# Altium footprint library MYLIB.PcbLib: 600 footprints (part 1 of 39)
Each footprint in its own frame and in the unit in brackets; x right, y up, seen from the top. Pads: shape width x height; smd on the part's side, far side on the other; paste and mask are expansions set on the pad; w line width, h text height; cw(c..) or ccw(c..) is an arc to the next point about the centre after c.
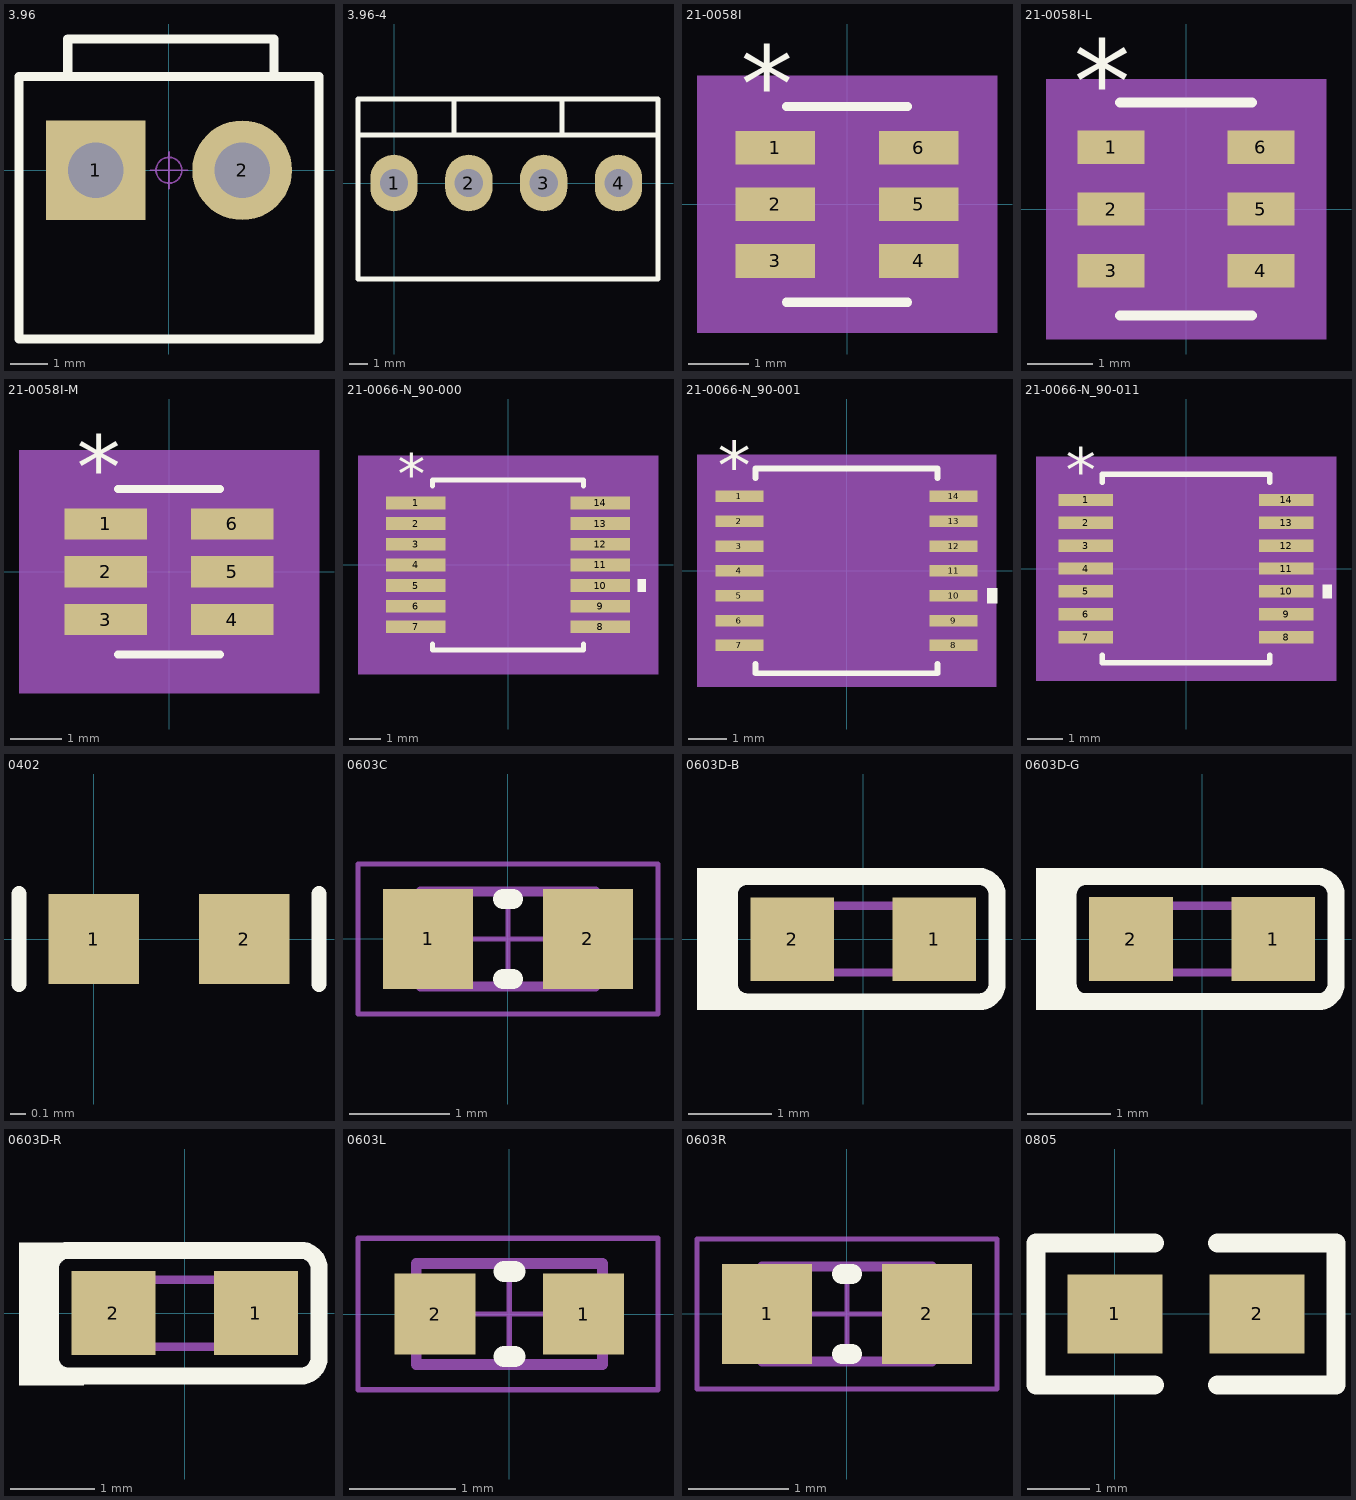
[diagram p0: the footprints below, top view; thin cyan lines are the x and y axes]

## 3.96 [mm] "接插件，25V/5A"
pads (2):
  rect 2.7x2.7 hole 1.5: 1(-1.98,0)
  round 2.7 hole 1.5: 2(1.982,0)
Top Overlay:
  lines w0.254: -2.742,2.54 -2.742,3.556 2.846,3.556 2.846,2.54 ; 4.065,0 4.065,-4.572 ; 4.065,-4.572 -2.336,-4.572 -4.063,-4.572 -4.063,2.54 4.065,2.54 4.065,-4.572
Mechanical 15:
  circle w0.05: c0,0 r0.35
  lines w0.05: -0.5,0 0.5,0 ; 0,-0.5 0,0.5
3D body "VH3.96右.STEP": height 10.5, standoff -3.3, extent -0.02,-4.4 4.03,4.16
3D body "VH3.96-左.STEP": height 10.5, standoff -3.3, extent -3.98,-4.4 0.07,4.16

## 3.96-4 [mm]
height 0.75
pads (4):
  oval 2.5x3 hole 1.5: 1(0,0) 2(3.96,0) 3(7.92,0) 4(11.88,0)
Top Overlay:
  lines w0.254: -1.905,2.54 13.97,2.54 ; 3.175,2.54 3.175,4.445 ; 8.89,2.54 8.89,4.445 ; -1.905,-5.08 13.97,-5.08 13.97,2.413 13.97,4.445 -1.905,4.445 -1.905,2.413 -1.905,-5.08
3D body: height 12, standoff 0, extent 11.137,-0.762 12.637,0.738
3D body: height 12, standoff 0, extent 7.175,-0.737 8.675,0.763
3D body: height 12, standoff 0, extent 3.212,-0.762 4.712,0.738
3D body: height 12, standoff 0, extent -0.75,-0.75 0.75,0.75
3D body: height 3, standoff 0, extent -1.904,-5.079 13.969,2.539
3D body: height 12, standoff 0, extent -1.904,2.541 3.174,4.444
3D body: height 12, standoff 0, extent 3.176,2.541 8.889,4.444
3D body: height 12, standoff 0, extent 8.891,2.541 13.969,4.444

## 21-0058I [mil]
pads (6):
  rect 52x22 smd paste+0 mask+0: 1(-47,37) 2(-47,0) 3(-47,-37) 4(47,-37) 5(47,0) 6(47,37)
Top Overlay:
  lines w6: -39.5,-64 39.5,-64 ; -39.5,64 39.5,64
  text "*" at -69.5,54 h50
Mechanical 5:
  region: 98,-84 -98,-84 -98,84 98,84
Mechanical 13:
  lines w0: -12,59 ccw(c0,59) 12,59
  lines w1: -59,-47 -34.5,-47 -34.5,-27 -59,-27 -59,-47 ; -59,-10 -34.5,-10 -34.5,10 -59,10 -59,-10 ; -59,27 -34.5,27 -34.5,47 -59,47 -59,27 ; -34.5,-59 -34.5,59 34.5,59 34.5,-59 -34.5,-59 ; 34.5,-47 59,-47 59,-27 34.5,-27 34.5,-47 ; 34.5,-10 59,-10 59,10 34.5,10 34.5,-10 ; 34.5,27 59,27 59,47 34.5,47 34.5,27
  text "*" at -32,6 h50
Mechanical 15:
  region: -44.5,-58 -83,-58 -83,58 -44.5,58 -44.5,69 44.5,69 44.5,58 83,58 83,-58 44.5,-58 44.5,-69 -44.5,-69
  lines w6: -83,-58 -44.5,-58 -44.5,-69 44.5,-69 44.5,-58 83,-58 83,58 44.5,58 44.5,69 -44.5,69 -44.5,58 -83,58 -83,-58
3D body: height 10, standoff 0, extent 0,0 10,10

## 21-0058I-L [mil]
pads (6):
  rect 40x20 smd paste+0 mask+0: 1(-45,37) 2(-45,0) 3(-45,-37) 4(45,-37) 5(45,0) 6(45,37)
Top Overlay:
  lines w6: -39.5,-64 39.5,-64 ; -39.5,64 39.5,64
  text "*" at -67.5,52 h50
Mechanical 5:
  region: 84,-78 -84,-78 -84,78 84,78
Mechanical 13:
  lines w0: -12,59 ccw(c0,59) 12,59
  lines w1: -59,-47 -59,-27 -34.5,-27 -34.5,-47 -59,-47 ; -59,-10 -59,10 -34.5,10 -34.5,-10 -59,-10 ; -59,27 -59,47 -34.5,47 -34.5,27 -59,27 ; -34.5,-59 34.5,-59 34.5,59 -34.5,59 -34.5,-59 ; 34.5,-47 34.5,-27 59,-27 59,-47 34.5,-47 ; 34.5,-10 34.5,10 59,10 59,-10 34.5,-10 ; 34.5,27 34.5,47 59,47 59,27 34.5,27
  text "*" at -32,6 h50
Mechanical 15:
  region: -38.5,-51 -69,-51 -69,51 -38.5,51 -38.5,63 38.5,63 38.5,51 69,51 69,-51 38.5,-51 38.5,-63 -38.5,-63
  lines w6: -69,-51 -69,51 -38.5,51 -38.5,63 38.5,63 38.5,51 69,51 69,-51 38.5,-51 38.5,-63 -38.5,-63 -38.5,-51 -69,-51
3D body: height 10, standoff 0, extent 0,0 10,10

## 21-0058I-M [mil]
pads (6):
  rect 64x24 smd paste+0 mask+0: 1(-49,37) 2(-49,0) 3(-49,-37) 4(49,-37) 5(49,0) 6(49,37)
Top Overlay:
  lines w6: -39.5,-64 39.5,-64 ; -39.5,64 39.5,64
  text "*" at -71.5,56 h50
Mechanical 5:
  region: 116,-94 -116,-94 -116,94 116,94
Mechanical 13:
  lines w0: -12,59 ccw(c0,59) 12,59
  lines w1: -59,-47 -59,-27 -34.5,-27 -34.5,-47 -59,-47 ; -59,-10 -59,10 -34.5,10 -34.5,-10 -59,-10 ; -59,27 -59,47 -34.5,47 -34.5,27 -59,27 ; -34.5,-59 34.5,-59 34.5,59 -34.5,59 -34.5,-59 ; 34.5,-47 34.5,-27 59,-27 59,-47 34.5,-47 ; 34.5,-10 34.5,10 59,10 59,-10 34.5,-10 ; 34.5,27 34.5,47 59,47 59,27 34.5,27
  text "*" at -32,6 h50
Mechanical 15:
  region: -54.5,-69 -101,-69 -101,69 -54.5,69 -54.5,79 54.5,79 54.5,69 101,69 101,-69 54.5,-69 54.5,-79 -54.5,-79
  lines w6: -101,-69 -101,69 -54.5,69 -54.5,79 54.5,79 54.5,69 101,69 101,-69 54.5,-69 54.5,-79 -54.5,-79 -54.5,-69 -101,-69
3D body: height 10, standoff 0, extent 0,0 10,10

## 21-0066-N_90-000 [mm]
pads (14):
  rect 1.866x0.402 smd paste+0 mask+0: 1(-2.901,1.95) 2(-2.901,1.3) 3(-2.901,0.65) 4(-2.901,0) 5(-2.901,-0.65) 6(-2.901,-1.3) 7(-2.901,-1.95) 8(2.901,-1.95) 9(2.901,-1.3) 10(2.901,-0.65) 11(2.901,0) 12(2.901,0.65) 13(2.901,1.3) 14(2.901,1.95)
Top Overlay:
  region: 4.088,-0.459 4.342,-0.459 4.342,-0.84 4.088,-0.84
  lines w0.152: -2.377,-2.484 -2.377,-2.677 2.377,-2.677 2.377,-2.484 ; -2.377,2.484 -2.377,2.677 2.377,2.677 2.377,2.484
  text "*" at -3.472,2.225 h1.27
Mechanical 5:
  region: 4.723,-3.439 -4.723,-3.439 -4.723,3.439 4.723,3.439
Mechanical 13:
  lines w0: -0.305,2.55 ccw(c0,2.55) 0.305,2.55
  lines w0.025: -3.275,-2.1 -2.25,-2.1 -2.25,-1.8 -3.275,-1.8 -3.275,-2.1 ; -3.275,-1.45 -2.25,-1.45 -2.25,-1.15 -3.275,-1.15 -3.275,-1.45 ; -3.275,-0.8 -2.25,-0.8 -2.25,-0.5 -3.275,-0.5 -3.275,-0.8 ; -3.275,-0.15 -2.25,-0.15 -2.25,0.15 -3.275,0.15 -3.275,-0.15 ; -3.275,0.5 -2.25,0.5 -2.25,0.8 -3.275,0.8 -3.275,0.5 ; -3.275,1.15 -2.25,1.15 -2.25,1.45 -3.275,1.45 -3.275,1.15 ; -3.275,1.8 -2.25,1.8 -2.25,2.1 -3.275,2.1 -3.275,1.8 ; -2.25,-2.55 -2.25,2.55 2.25,2.55 2.25,-2.55 -2.25,-2.55 ; 2.25,-2.1 3.275,-2.1 3.275,-1.8 2.25,-1.8 2.25,-2.1 ; 2.25,-1.45 3.275,-1.45 3.275,-1.15 2.25,-1.15 2.25,-1.45 ; 2.25,-0.8 3.275,-0.8 3.275,-0.5 2.25,-0.5 2.25,-0.8 ; 2.25,-0.15 3.275,-0.15 3.275,0.15 2.25,0.15 2.25,-0.15 ; 2.25,0.5 3.275,0.5 3.275,0.8 2.25,0.8 2.25,0.5 ; 2.25,1.15 3.275,1.15 3.275,1.45 2.25,1.45 2.25,1.15 ; 2.25,1.8 3.275,1.8 3.275,2.1 2.25,2.1 2.25,1.8
  text "*" at -2.187,1.204 h1.27
Mechanical 15:
  region: -2.758,-2.659 -4.342,-2.659 -4.342,2.659 -2.758,2.659 -2.758,3.058 2.758,3.058 2.758,2.659 4.342,2.659 4.342,-2.659 2.758,-2.659 2.758,-3.058 -2.758,-3.058
  lines w0.152: -4.342,-2.659 -2.758,-2.659 -2.758,-3.058 2.758,-3.058 2.758,-2.659 4.342,-2.659 4.342,2.659 2.758,2.659 2.758,3.058 -2.758,3.058 -2.758,2.659 -4.342,2.659 -4.342,-2.659
3D body: height 0.25, standoff 0, extent 0,0 0.254,0.254

## 21-0066-N_90-001 [mm]
pads (14):
  rect 1.256x0.3 smd paste+0 mask+0: 1(-2.799,1.95) 2(-2.799,1.3) 3(-2.799,0.65) 4(-2.799,0) 5(-2.799,-0.65) 6(-2.799,-1.3) 7(-2.799,-1.95) 8(2.799,-1.95) 9(2.799,-1.3) 10(2.799,-0.65) 11(2.799,0) 12(2.799,0.65) 13(2.799,1.3) 14(2.799,1.95)
Top Overlay:
  region: 3.681,-0.459 3.935,-0.459 3.935,-0.84 3.681,-0.84
  lines w0.152: -2.377,-2.433 -2.377,-2.677 2.377,-2.677 2.377,-2.433 ; -2.377,2.433 -2.377,2.677 2.377,2.677 2.377,2.433
  text "*" at -3.371,2.123 h1.27
Mechanical 5:
  region: 3.91,-3.033 -3.91,-3.033 -3.91,3.033 3.91,3.033
Mechanical 13:
  lines w0: -0.305,2.55 ccw(c0,2.55) 0.305,2.55
  lines w0.025: -3.275,-2.1 -2.25,-2.1 -2.25,-1.8 -3.275,-1.8 -3.275,-2.1 ; -3.275,-1.45 -2.25,-1.45 -2.25,-1.15 -3.275,-1.15 -3.275,-1.45 ; -3.275,-0.8 -2.25,-0.8 -2.25,-0.5 -3.275,-0.5 -3.275,-0.8 ; -3.275,-0.15 -2.25,-0.15 -2.25,0.15 -3.275,0.15 -3.275,-0.15 ; -3.275,0.5 -2.25,0.5 -2.25,0.8 -3.275,0.8 -3.275,0.5 ; -3.275,1.15 -2.25,1.15 -2.25,1.45 -3.275,1.45 -3.275,1.15 ; -3.275,1.8 -2.25,1.8 -2.25,2.1 -3.275,2.1 -3.275,1.8 ; -2.25,-2.55 -2.25,2.55 2.25,2.55 2.25,-2.55 -2.25,-2.55 ; 2.25,-2.1 3.275,-2.1 3.275,-1.8 2.25,-1.8 2.25,-2.1 ; 2.25,-1.45 3.275,-1.45 3.275,-1.15 2.25,-1.15 2.25,-1.45 ; 2.25,-0.8 3.275,-0.8 3.275,-0.5 2.25,-0.5 2.25,-0.8 ; 2.25,-0.15 3.275,-0.15 3.275,0.15 2.25,0.15 2.25,-0.15 ; 2.25,0.5 3.275,0.5 3.275,0.8 2.25,0.8 2.25,0.5 ; 2.25,1.15 3.275,1.15 3.275,1.45 2.25,1.45 2.25,1.15 ; 2.25,1.8 3.275,1.8 3.275,2.1 2.25,2.1 2.25,1.8
  text "*" at -2.187,1.204 h1.27
Mechanical 15:
  region: -2.352,-2.202 -3.529,-2.202 -3.529,2.202 -2.352,2.202 -2.352,2.652 2.352,2.652 2.352,2.202 3.529,2.202 3.529,-2.202 2.352,-2.202 2.352,-2.652 -2.352,-2.652
  lines w0.152: -3.529,-2.202 -2.352,-2.202 -2.352,-2.652 2.352,-2.652 2.352,-2.202 3.529,-2.202 3.529,2.202 2.352,2.202 2.352,2.652 -2.352,2.652 -2.352,2.202 -3.529,2.202 -3.529,-2.202
3D body: height 0.25, standoff 0, extent 0,0 0.254,0.254

## 21-0066-N_90-011 [mm]
pads (14):
  rect 1.561x0.351 smd paste+0 mask+0: 1(-2.85,1.95) 2(-2.85,1.3) 3(-2.85,0.65) 4(-2.85,0) 5(-2.85,-0.65) 6(-2.85,-1.3) 7(-2.85,-1.95) 8(2.85,-1.95) 9(2.85,-1.3) 10(2.85,-0.65) 11(2.85,0) 12(2.85,0.65) 13(2.85,1.3) 14(2.85,1.95)
Top Overlay:
  region: 3.885,-0.459 4.139,-0.459 4.139,-0.84 3.885,-0.84
  lines w0.152: -2.377,-2.458 -2.377,-2.677 2.377,-2.677 2.377,-2.458 ; -2.377,2.458 -2.377,2.677 2.377,2.677 2.377,2.458
  text "*" at -3.421,2.174 h1.27
Mechanical 5:
  region: 4.266,-3.185 -4.266,-3.185 -4.266,3.185 4.266,3.185
Mechanical 13:
  lines w0: -0.305,2.55 ccw(c0,2.55) 0.305,2.55
  lines w0.025: -3.275,-2.1 -2.25,-2.1 -2.25,-1.8 -3.275,-1.8 -3.275,-2.1 ; -3.275,-1.45 -2.25,-1.45 -2.25,-1.15 -3.275,-1.15 -3.275,-1.45 ; -3.275,-0.8 -2.25,-0.8 -2.25,-0.5 -3.275,-0.5 -3.275,-0.8 ; -3.275,-0.15 -2.25,-0.15 -2.25,0.15 -3.275,0.15 -3.275,-0.15 ; -3.275,0.5 -2.25,0.5 -2.25,0.8 -3.275,0.8 -3.275,0.5 ; -3.275,1.15 -2.25,1.15 -2.25,1.45 -3.275,1.45 -3.275,1.15 ; -3.275,1.8 -2.25,1.8 -2.25,2.1 -3.275,2.1 -3.275,1.8 ; -2.25,-2.55 -2.25,2.55 2.25,2.55 2.25,-2.55 -2.25,-2.55 ; 2.25,-2.1 3.275,-2.1 3.275,-1.8 2.25,-1.8 2.25,-2.1 ; 2.25,-1.45 3.275,-1.45 3.275,-1.15 2.25,-1.15 2.25,-1.45 ; 2.25,-0.8 3.275,-0.8 3.275,-0.5 2.25,-0.5 2.25,-0.8 ; 2.25,-0.15 3.275,-0.15 3.275,0.15 2.25,0.15 2.25,-0.15 ; 2.25,0.5 3.275,0.5 3.275,0.8 2.25,0.8 2.25,0.5 ; 2.25,1.15 3.275,1.15 3.275,1.45 2.25,1.45 2.25,1.15 ; 2.25,1.8 3.275,1.8 3.275,2.1 2.25,2.1 2.25,1.8
  text "*" at -2.187,1.204 h1.27
Mechanical 15:
  region: -2.504,-2.379 -3.885,-2.379 -3.885,2.379 -2.504,2.379 -2.504,2.804 2.504,2.804 2.504,2.379 3.885,2.379 3.885,-2.379 2.504,-2.379 2.504,-2.804 -2.504,-2.804
  lines w0.152: -3.885,-2.379 -2.504,-2.379 -2.504,-2.804 2.504,-2.804 2.504,-2.379 3.885,-2.379 3.885,2.379 2.504,2.379 2.504,2.804 -2.504,2.804 -2.504,2.379 -3.885,2.379 -3.885,-2.379
3D body: height 0.25, standoff 0, extent 0,0 0.254,0.254

## 0402 [mm]
pads (2):
  rect 0.6x0.6 smd: 1(0,0) 2(1,0)
Top Overlay:
  lines w0.1: -0.495,-0.3 -0.495,0 -0.495,0.3 ; 1.495,-0.3 1.495,0 1.495,0.3

## 0603C [mm] "Chip Capacitor, Body 1.6x0.8mm, Height 1.0mm, IPC Medium Density"
height 1
pads (2):
  rect 0.9x1 smd: 1(-0.8,0) 2(0.8,0)
Top Overlay:
  lines w0.2: -0.05,-0.4 0.05,-0.4 ; -0.05,0.4 0.05,0.4
Mechanical 13:
  lines w0.1: -0.875,-0.475 -0.875,0.475 0.875,0.475 0.875,-0.475 -0.875,-0.475
Mechanical 15:
  lines w0.05: -0.475,0 0.475,0 ; 0,-0.475 0,0.475 ; -1.5,-0.75 -1.5,0.75 1.5,0.75 1.5,-0.75 -1.5,-0.75
3D body: height 1, standoff 0, extent -0.525,-0.475 0.525,0.475
3D body: height 1, standoff 0, extent -0.875,-0.475 -0.525,0.475
3D body: height 1, standoff 0, extent 0.525,-0.475 0.875,0.475

## 0603D-B [mm] "LED, SMT, Body 1.6 x 0.8 mm, 0.25mm Thickness"
height 0.25
pads (2):
  rect 1x1 smd paste+0 mask+0: 1(0.85,0) 2(-0.85,0)
Top Overlay:
  rectangle: -1.797,-0.849 -1.213,-0.684
  rectangle: -1.988,-0.849 -1.531,0.852
  rectangle: -1.797,0.667 -1.147,0.852
  lines w0.203: -1.602,-0.533 ccw(c-1.386,-0.533) -1.386,-0.749 1.386,-0.749 ccw(c1.386,-0.533) 1.602,-0.533 1.602,0.533 ccw(c1.386,0.533) 1.386,0.749 -1.386,0.749 ccw(c-1.386,0.533) -1.602,0.533 -1.602,-0.533
Mechanical 7:
  lines w0.1: -0.8,-0.4 0.8,-0.4 0.8,0.4 -0.8,0.4 -0.8,-0.4
3D body: height 0.25, standoff 0.1, extent -0.6,-0.4 0.6,0.4
3D body: height 0.2, standoff 0.15, extent -0.254,-0.254 0.254,0.254
3D body: height 0.1, standoff 0, extent -0.8,-0.4 0.8,0.4

## 0603D-G [mm] "LED, SMT, Body 1.6 x 0.8 mm, 0.25mm Thickness"
height 0.25
pads (2):
  rect 1x1 smd paste+0 mask+0: 1(0.85,0) 2(-0.85,0)
Top Overlay:
  rectangle: -1.794,-0.85 -1.21,-0.685
  rectangle: -1.985,-0.85 -1.528,0.852
  rectangle: -1.794,0.666 -1.144,0.852
  lines w0.203: -1.602,-0.533 ccw(c-1.386,-0.533) -1.386,-0.749 1.386,-0.749 ccw(c1.386,-0.533) 1.602,-0.533 1.602,0.533 ccw(c1.386,0.533) 1.386,0.749 -1.386,0.749 ccw(c-1.386,0.533) -1.602,0.533 -1.602,-0.533
Mechanical 7:
  lines w0.1: -0.8,-0.4 0.8,-0.4 0.8,0.4 -0.8,0.4 -0.8,-0.4
3D body: height 0.25, standoff 0.1, extent -0.6,-0.4 0.6,0.4
3D body: height 0.2, standoff 0.15, extent -0.254,-0.254 0.254,0.254
3D body: height 0.1, standoff 0, extent -0.8,-0.4 0.8,0.4

## 0603D-R [mm] "LED, SMT, Body 1.6 x 0.8 mm, 0.25mm Thickness"
height 0.25
pads (2):
  rect 1x1 smd paste+0 mask+0: 1(0.85,0) 2(-0.85,0)
Top Overlay:
  rectangle: -1.785,0.656 -1.134,0.841
  rectangle: -1.975,-0.861 -1.518,0.841
  rectangle: -1.785,-0.861 -1.2,-0.696
  lines w0.203: -1.602,-0.533 ccw(c-1.386,-0.533) -1.386,-0.749 1.386,-0.749 ccw(c1.386,-0.533) 1.602,-0.533 1.602,0.533 ccw(c1.386,0.533) 1.386,0.749 -1.386,0.749 ccw(c-1.386,0.533) -1.602,0.533 -1.602,-0.533
Mechanical 7:
  lines w0.1: -0.8,-0.4 -0.8,0.4 0.8,0.4 0.8,-0.4 -0.8,-0.4
3D body: height 0.1, standoff 0, extent -0.8,-0.4 0.8,0.4
3D body: height 0.2, standoff 0.15, extent -0.254,-0.254 0.254,0.254
3D body: height 0.25, standoff 0.1, extent -0.6,-0.4 0.6,0.4

## 0603L [mil] "Bead 0603L"
height 39.37
pads (2):
  rect 30x30 smd: 1(27.5,0) 2(-27.5,0)
Top Overlay:
  lines w7.87: -1.97,-15.74 1.97,-15.74 -1.97,-15.75 ; -1.97,15.75 1.97,15.75 -1.97,15.75
Mechanical 13:
  lines w3.94: -34.45,-18.7 -34.45,18.7 34.45,18.7 34.45,-18.7 -34.45,-18.7
Mechanical 15:
  lines w1.97: -18.7,0 18.7,0 ; 0,-18.7 0,18.7 ; -56,-28 55,-28 55,28 -56,28 -56,-28
3D body: height 23.62, standoff 0, extent -20.67,-18.7 20.67,18.7
3D body: height 23.62, standoff 0, extent -34.45,-18.7 -20.67,18.7
3D body: height 23.62, standoff 0, extent 20.67,-18.7 34.45,18.7

## 0603R [mm] "Chip Resistor, Body 1.6x0.8mm, IPC Medium Density"
height 0.6
pads (2):
  rect 0.9x1 smd: 1(-0.8,0) 2(0.8,0)
Top Overlay:
  lines w0.2: -0.05,-0.4 0.05,-0.4 ; -0.05,0.4 0.05,0.4
Mechanical 13:
  lines w0.1: -0.85,-0.475 0.85,-0.475 0.85,0.475 -0.85,0.475 -0.85,-0.475
Mechanical 15:
  lines w0.05: -0.475,0 0.475,0 ; 0,-0.475 0,0.475 ; -1.5,-0.75 1.5,-0.75 1.5,0.75 -1.5,0.75 -1.5,-0.75
3D body: height 0.6, standoff 0, extent -0.849,-0.474 -0.58,0.475
3D body: height 0.6, standoff 0, extent -0.58,-0.474 0.581,0.475
3D body: height 0.6, standoff 0, extent 0.581,-0.474 0.85,0.475

## 0805 [mil]
pads (2):
  rect 60x50 smd: 1(0,-0.06) 2(90,-0.06)
Top Overlay:
  lines w12: 25,-45.06 -50,-45.06 -50,44.94 25,44.94 ; 65,-45.06 140,-45.06 140,44.94 65,44.94